# Altium footprint library Electronic Devices_LIB.PcbLib: 410 footprints (part 20 of 26)
Each footprint in its own frame and in the unit in brackets; x right, y up, seen from the top. Pads: shape width x height; smd on the part's side, far side on the other; paste and mask are expansions set on the pad; w line width, h text height; cw(c..) or ccw(c..) is an arc to the next point about the centre after c.
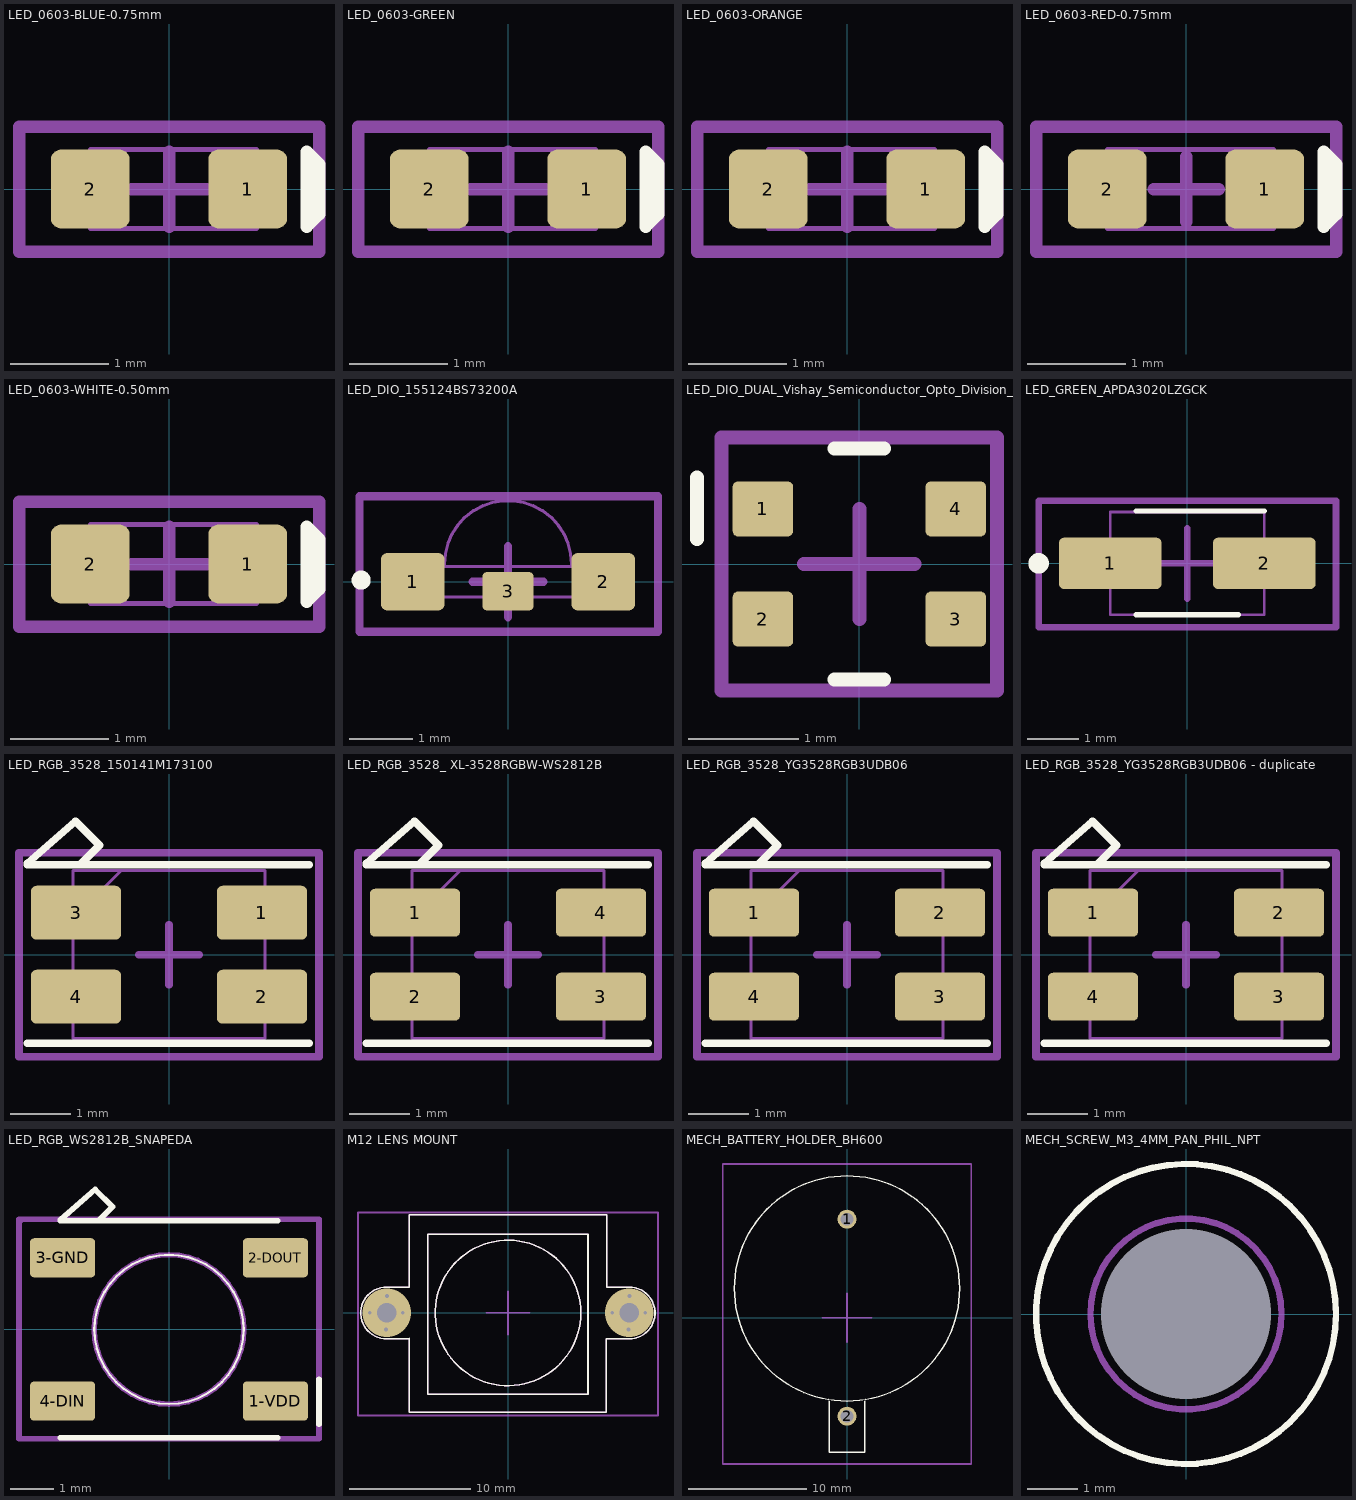
[diagram p19: the footprints below, top view; thin cyan lines are the x and y axes]

## LED_0603-BLUE-0.75mm [mm] "LED 0603 BLUE height = 0.75mm"
height 0.75
pads (2):
  rrect25% 0.8x0.8 smd: 1(0.8,0) 2(-0.8,0)
Top Overlay:
  lines w0.127: 1.397,-0.381 1.397,0.381 1.524,0.254 1.524,-0.254 1.397,-0.381
Top Assembly:
  lines w0.051: 0.8,-0.4 0.889,-0.4 0.889,0.4 0.8,0.4 ; 0.8,-0.4 -0.8,-0.4 -0.8,0.4 0.8,0.4 ; 0.8,-0.4 0.8,0.4
  text ".Designator" at -2.362,-0.161 h0.51
Top Courtyard:
  lines w0.127: -0.381,0 0,0 ; 0,-0.381 0,0 ; 0,0.381 0,0 ; 0.381,0 0,0 ; -1.524,-0.635 1.524,-0.635 1.524,0.635 -1.524,0.635 -1.524,-0.635
3D body "APT1608_0.75mm_BLUE.STEP": height 0.75, standoff 0, extent -0.801,-0.4 0.81,0.4

## LED_0603-GREEN [mm] "1.60mm L x 0.80mm W"
height 0.65
pads (2):
  rrect25% 0.8x0.8 smd: 1(0.8,0) 2(-0.8,0)
Top Overlay:
  lines w0.127: 1.397,-0.381 1.524,-0.254 1.524,0.254 1.397,0.381 1.397,-0.381
Top Assembly:
  lines w0.051: 0.8,-0.4 0.8,0.4 ; 0.8,-0.4 -0.8,-0.4 -0.8,0.4 0.8,0.4 ; 0.8,-0.4 0.889,-0.4 0.889,0.4 0.8,0.4
  text ".Designator" at -2.362,-0.161 h0.51
Top Courtyard:
  lines w0.127: -0.381,0 0,0 ; 0,-0.381 0,0 ; 0,0.381 0,0 ; 0.381,0 0,0 ; -1.524,-0.635 -1.524,0.635 1.524,0.635 1.524,-0.635 -1.524,-0.635
3D body "LTST-C191KGKT.stp": height 0.55, standoff 0, extent -0.83,-0.4 0.77,0.4

## LED_0603-ORANGE [mm] "LED 0603 ORANGE height = 0.35mm"
height 0.35
pads (2):
  rrect25% 0.8x0.8 smd: 1(0.8,0) 2(-0.8,0)
Top Overlay:
  lines w0.127: 1.397,-0.381 1.397,0.381 1.524,0.254 1.524,-0.254 1.397,-0.381
Top Assembly:
  lines w0.051: 0.8,-0.4 0.889,-0.4 0.889,0.4 0.8,0.4 ; 0.8,-0.4 -0.8,-0.4 -0.8,0.4 0.8,0.4 ; 0.8,-0.4 0.8,0.4
  text ".Designator" at -2.362,-0.161 h0.51
Top Courtyard:
  lines w0.127: -0.381,0 0,0 ; 0,-0.381 0,0 ; 0,0.381 0,0 ; 0.381,0 0,0 ; -1.524,-0.635 1.524,-0.635 1.524,0.635 -1.524,0.635 -1.524,-0.635
3D body "LTST-C193KFKT-5A.STEP": height 0.65, standoff 0, extent -0.8,-0.4 0.8,0.4

## LED_0603-RED-0.75mm [mm] "LED 0603 RED height = 0.75mm"
height 0.75
pads (2):
  rrect25% 0.8x0.8 smd: 1(0.8,0) 2(-0.8,0)
Top Overlay:
  lines w0.127: 1.397,-0.381 1.397,0.381 1.524,0.254 1.524,-0.254 1.397,-0.381
Top Assembly:
  lines w0.05: -0.8,-0.4 -0.8,0.4 ; 0.8,-0.4 0.8,0.4
  lines w0.051: -0.8,-0.4 0.889,-0.4 0.889,0.4 0.8,0.4 -0.8,0.4
  text "'.Designator'" at -1.524,-0.254 h0.25
Top Courtyard:
  lines w0.127: -0.33,0 0,0 ; 0,-0.33 0,0 ; 0,0.33 0,0 ; 0.33,0 0,0 ; -1.524,-0.635 1.524,-0.635 1.524,0.635 -1.524,0.635 -1.524,-0.635
3D body "APT1608_0.75mm_RED.STEP": height 0.8, standoff 0.05, extent -0.801,-0.4 0.81,0.4

## LED_0603-WHITE-0.50mm [mm] "LED 0603 WHITE height = 0.50mm"
height 0.5
pads (2):
  rrect25% 0.8x0.8 smd: 1(0.8,0) 2(-0.8,0)
Top Overlay:
  lines w0.127: 1.397,-0.381 1.524,-0.254 1.524,0.254 1.397,0.381 1.397,-0.381
Top Assembly:
  lines w0.051: 0.8,-0.4 0.8,0.4 ; 0.8,-0.4 -0.8,-0.4 -0.8,0.4 0.8,0.4 ; 0.8,-0.4 0.889,-0.4 0.889,0.4 0.8,0.4
  text ".Designator" at -2.235,-0.161 h0.51
Top Courtyard:
  lines w0.127: -0.381,0 0,0 ; 0,-0.381 0,0 ; 0,0.381 0,0 ; 0.381,0 0,0 ; -1.524,-0.635 -1.524,0.635 1.524,0.635 1.524,-0.635 -1.524,-0.635
3D body "EAST16084BA1.STEP": height 0.4, standoff 0.01, extent -0.8,-0.4 0.8,0.4

## LED_DIO_155124BS73200A [mm]
pads (3):
  rrect20% 1x0.9 smd: 1(-1.5,0) 2(1.5,0)
  rrect20% 0.8x0.6 smd: 3(0,-0.15)
Top Overlay:
  lines w0.2: -2.362,0.025 ccw(c-2.312,0.025) -2.262,0.025 ccw(c-2.312,0.025) -2.362,0.025
Top Assembly:
  lines w0.051: -1,0.24 -1,0.28 cw(c0,0.28) 1,0.28 1,0.24 ; -1.6,-0.24 1.6,-0.24 1.6,0.24 -1.6,0.24 -1.6,-0.24
  text ".Designator" at -2.464,0.017 h0.51
Top Courtyard:
  lines w0.127: -0.559,0 0,0 ; 0,-0.559 0,0 ; 0,0.559 0,0 ; 0.559,0 0,0 ; -2.337,-0.787 2.362,-0.787 2.362,1.346 -2.337,1.346 -2.337,-0.787
3D body "Diode_Lite-On_LTST-S110TBKT_eec.STEP": height 1.1, standoff 0, extent -1.6,-0.238 1.6,1.254

## LED_DIO_DUAL_Vishay_Semiconductor_Opto_Division_6.550-5347.01-4_MFG [mm] "2-SMD, No Lead"
height 0.6
pads (4):
  rrect20% 0.55x0.5 smd paste+0: 1(-0.875,0.5) 2(-0.875,-0.5) 3(0.875,-0.5) 4(0.875,0.5)
Top Overlay:
  lines w0.127: -1.473,0.229 -1.473,0.787 ; -0.225,-1.05 0.225,-1.05 ; -0.225,1.05 0.225,1.05
Top Assembly:
  text ".Designator" at -2.515,-0.161 h0.51
Top Courtyard:
  lines w0.127: -0.5,0 0.5,0 ; 0,-0.5 0,0.5 ; -1.25,-1.15 1.25,-1.15 1.25,1.15 -1.25,1.15 -1.25,-1.15
3D body "Diode_Vishay_Semiconductor_Opto_Division_VSMD66694_eec.STEP": height 0.25, standoff 0, extent -1.25,-1.15 1.25,1.15

## LED_GREEN_APDA3020LZGCK [mm]
pads (2):
  rrect20% 2x1 smd: 1(-1.5,0) 2(1.5,0)
Top Overlay:
  lines w0.1: -1,-1 1,-1 ; -1,1.016 1.499,1.016
  lines w0.3: -2.946,0 cw(c-2.896,0) -2.846,0 cw(c-2.896,0) -2.946,0
Top Assembly:
  lines w0.051: -1.5,-1 -1.5,1 1.5,1 1.5,-1 -1.5,-1
  text ".Designator" at -2.388,-0.212 h0.51
Top Courtyard:
  lines w0.127: -0.686,0 0,0 ; 0,-0.686 0,0 ; 0,0.686 0,0 ; 0.686,0 0,0 ; -2.896,-1.245 2.896,-1.245 2.896,1.219 -2.896,1.219 -2.896,-1.245
3D body "APDA3020LZGCK.stp": height 2.01, standoff 0.01, extent -1.5,-2.464 1.5,0.331

## LED_RGB_3528_150141M173100 [mm] "SMT Full-color TOP LED Waterclear, body 3.5x2.8mm"
height 2.1
pads (4):
  rrect20% 1.5x0.9 smd: 1(1.55,0.7) 2(1.55,-0.7) 3(-1.55,0.7) 4(-1.55,-0.7)
Top Overlay:
  lines w0.127: -2.362,-1.473 2.337,-1.473 ; -2.358,1.499 -1.458,1.499 2.337,1.499 ; -2.358,1.524 -1.558,2.224 -1.158,1.824 -1.458,1.524 -1.471,1.511
Top Assembly:
  lines w0.051: -1.6,0.6 -0.8,1.4 ; -1.6,-1.4 -1.6,1.4 1.6,1.4 1.6,-1.4 -1.6,-1.4
  text ".Designator" at -2.565,-0.237 h0.51
Top Courtyard:
  lines w0.127: -0.5,0 0.5,0 ; 0,-0.5 0,0.5 ; -2.5,-1.7 2.5,-1.7 2.5,1.7 -2.5,1.7 -2.5,-1.7
3D body "150141xxx.stp": height 1.9, standoff 0, extent -1.75,-1.4 1.75,1.4

## LED_RGB_3528_ XL-3528RGBW-WS2812B [mm] "SMT Full-color TOP LED Waterclear, body 3.5x2.8mm"
height 2.1
pads (4):
  rrect20% 1.5x0.8 smd: 1(-1.55,0.7) 2(-1.55,-0.7) 3(1.55,-0.7) 4(1.55,0.7)
Top Overlay:
  lines w0.127: -2.362,-1.473 2.337,-1.473 ; -2.358,1.499 -1.458,1.499 2.337,1.499 ; -2.358,1.524 -1.558,2.224 -1.158,1.824 -1.458,1.524 -1.471,1.511
Top Assembly:
  lines w0.051: -1.6,0.6 -0.8,1.4 ; -1.6,-1.4 -1.6,1.4 1.6,1.4 1.6,-1.4 -1.6,-1.4
  text ".Designator" at -2.565,-0.237 h0.51
Top Courtyard:
  lines w0.127: -0.5,0 0.5,0 ; 0,-0.5 0,0.5 ; -2.5,-1.7 2.5,-1.7 2.5,1.7 -2.5,1.7 -2.5,-1.7
3D body "150141xxx.stp": height 1.9, standoff 0, extent -1.75,-1.4 1.75,1.4

## LED_RGB_3528_YG3528RGB3UDB06 [mm] "SMT Full-color TOP LED Waterclear, body 3.5x2.8mm"
height 2.1
pads (4):
  rrect20% 1.5x0.8 smd: 1(-1.55,0.7) 2(1.55,0.7) 3(1.55,-0.7) 4(-1.55,-0.7)
Top Overlay:
  lines w0.127: -2.362,-1.473 2.337,-1.473 ; -2.358,1.499 -1.458,1.499 2.337,1.499 ; -2.358,1.524 -1.558,2.224 -1.158,1.824 -1.458,1.524 -1.471,1.511
Top Assembly:
  lines w0.051: -1.6,0.6 -0.8,1.4 ; -1.6,-1.4 1.6,-1.4 1.6,1.4 -1.6,1.4 -1.6,-1.4
  text ".Designator" at -2.565,-0.237 h0.51
Top Courtyard:
  lines w0.127: -0.5,0 0.5,0 ; 0,-0.5 0,0.5 ; -2.5,-1.7 -2.5,1.7 2.5,1.7 2.5,-1.7 -2.5,-1.7
3D body "150141xxx.stp": height 1.9, standoff 0, extent -1.75,-1.4 1.75,1.4

## LED_RGB_3528_YG3528RGB3UDB06 - duplicate [mm] "SMT Full-color TOP LED Waterclear, body 3.5x2.8mm"
height 2.1
pads (4):
  rrect20% 1.5x0.8 smd: 1(-1.55,0.7) 2(1.55,0.7) 3(1.55,-0.7) 4(-1.55,-0.7)
Top Overlay:
  lines w0.127: -2.362,-1.473 2.337,-1.473 ; -2.358,1.499 -1.458,1.499 2.337,1.499 ; -2.358,1.524 -1.558,2.224 -1.158,1.824 -1.458,1.524 -1.471,1.511
Top Assembly:
  lines w0.051: -1.6,0.6 -0.8,1.4 ; -1.6,-1.4 -1.6,1.4 1.6,1.4 1.6,-1.4 -1.6,-1.4
  text ".Designator" at -2.565,-0.237 h0.51
Top Courtyard:
  lines w0.127: -0.5,0 0.5,0 ; 0,-0.5 0,0.5 ; -2.5,-1.7 2.5,-1.7 2.5,1.7 -2.5,1.7 -2.5,-1.7
3D body "150141xxx.stp": height 1.9, standoff 0, extent -1.75,-1.4 1.75,1.4

## LED_RGB_WS2812B_SNAPEDA [mm] "SMD 5050"
height 1.57
pads (4):
  rrect20% 1.5x0.9 smd: 1-VDD(2.45,-1.65) 2-DOUT(2.45,1.65) 3-GND(-2.45,1.65) 4-DIN(-2.45,-1.65)
Top Overlay:
  circle w0.051: c0,0 r1.72
  lines w0.127: -2.5,-2.5 2.5,-2.5 ; -2.5,2.5 -1.6,2.5 2.5,2.5 ; -2.5,2.525 -1.7,3.225 -1.3,2.825 -1.6,2.525 -1.613,2.513 ; 3.454,-2.184 3.454,-1.143
Top Assembly:
  circle w0.127: c0,0 r1.72
  text ".Designator" at -2.565,-0.11 h0.51
Top Courtyard:
  lines w0.127: -3.454,2.464 -3.429,2.489 ; -3.454,-2.515 3.175,-2.515 3.454,-2.515 3.454,2.54 -3.454,2.54 -3.454,-2.515
3D body "WS2812B--3DModel-STEP-510211.STEP": height 1.63, standoff 0.01, extent -2.7,-2.5 2.7,2.5

## M12 LENS MOUNT [mm] "Pitch 20mm"
height 10
via 9.992,0 diameter 4 hole 1.6
via -10.008,0 diameter 4 hole 1.6
via -8.687,0 diameter 0.6 hole 0.3
via -11.405,0 diameter 0.6 hole 0.3
via -9.982,1.397 diameter 0.6 hole 0.3
via -10.058,-1.372 diameter 0.6 hole 0.3
via 11.313,0 diameter 0.6 hole 0.3
via 8.595,0 diameter 0.6 hole 0.3
via 10.018,1.397 diameter 0.6 hole 0.3
via 9.942,-1.372 diameter 0.6 hole 0.3
Top Overlay:
  circle w0.127: c0,0 r6
  lines w0.127: -10.008,-2.134 cw(c-10.008,0) -10.008,2.134 -8.153,2.134 -8.153,8.077 7.976,8.077 8.128,8.077 8.138,8.067 8.138,2.109 9.993,2.127 ; -10.008,-2.127 -8.153,-2.109 -8.153,-8.179 7.976,-8.179 8.098,-8.179 8.098,-2.134 9.992,-2.134 ccw(c9.992,0) 9.993,2.134 ; 6.596,6.494 6.596,-6.706 -6.604,-6.706 -6.604,6.502 6.604,6.502
Top Assembly:
  circle w0.127: c0,0 r6
  lines w0.127: -10.008,-2.134 cw(c-10.008,0) -10.008,2.134 -8.153,2.134 -8.153,8.077 7.976,8.077 8.128,8.077 8.138,8.067 8.138,2.109 9.993,2.127 ; -10.008,-2.127 -8.153,-2.109 -8.153,-8.179 7.976,-8.179 8.098,-8.179 8.098,-2.134 9.992,-2.134 ccw(c9.992,0) 9.993,2.134 ; 6.596,6.494 6.596,-6.706 -6.604,-6.706 -6.604,6.502 6.604,6.502
  text ".Designator" at -2.464,-0.136 h0.51
Top Courtyard:
  lines w0.127: -1.778,0 0,0 ; 0,-1.778 0,0 ; 0,1.778 0,0 ; 1.778,0 0,0 ; -12.37,-8.458 12.37,-8.458 12.37,8.28 -12.37,8.28 -12.37,-8.458
3D body "CLA020-PCG.stp": height 10.07, standoff 0.07, extent -11.989,-8.052 11.989,7.948

## MECH_BATTERY_HOLDER_BH600 [mm]
pads (2):
  round 1.6 hole 1.067: 1(0,8.33) 2(0,-8.33)
Top Overlay:
  lines w0.127: -1.5,-7.055 -1.5,-11.375 1.5,-11.375 1.5,-7.055 ; 0,-7.055 cw(c0,2.47) 0,11.995 cw(c0,2.47) 0,-7.055
Top Assembly:
  text ".Designator" at -2.438,3.343 h0.51
Top Courtyard:
  lines w0.127: -2.083,0 0,0 ; 0,-2.083 0,0 ; 0,2.083 0,0 ; 2.083,0 0,0 ; -10.525,-12.375 10.525,-12.375 10.525,12.995 -10.525,12.995 -10.525,-12.375

## MECH_SCREW_M3_4MM_PAN_PHIL_NPT [mm] "Mechanical Screw, M3, 4mm, Pan Head, Philips, Non-Plated Hole"
height 2.4
pads (1):
  oval 2.2x0 hole 3.4 unplated mask+0.102: 1(0,0)
Top Overlay:
  circle w0.127: c0,0 r3
Top Courtyard:
  circle w0.127: c0,0 r1.909
Top 3D Body:
  circle w0.051: c0,0 r1.5
  circle w0.051: c0,0 r3
3D body "92005A112_M3_4MM_PAN_PHILLIPS_STEEL.STEP": height 2.34, standoff -4, extent -3,-3 3,3